# Altium integrated library u025Library.IntLib: 74 symbols (continued)
## Res Pack4
designator R?
Isolated Resistor Network; Published: 24-Mar-1999; LatestRevisionDate: 29-May-2009; LatestRevisionNote: IPC-7351 Footprint Added.; PackageReference: SO-16; Publisher: Altium Limited; PackageDescription: 16-Pin Small Outline Integrated Circuit 1.27 mm Pitch; Code_JEDEC: MS-012-AC; Code_IPC: SOIC127P600-16; Value: *
footprint SMD-Resistor Network 4 0603 (SMD-Resistor Network 4 0603 32mm*16mm)
pins: 1, 2, 3, 4, 5, 6, 7, 8

## RJ45
designator P?
RJ45 Connector
footprint RJ45Min
footprint RJ45 8P8C
pins: 1, 2, 3, 4, 5, 6, 7, 8

## Rocker Switch 3P
designator SW?, comment SW  (value not drawn)
Rocker Switch 3P; Published: 24-Mar-1999; LatestRevisionDate: 17-Jul-2002; LatestRevisionNote: Re-released for DXP Platform.; PackageReference: DIP-4; Publisher: Altium Limited
footprint Rocker Switch 2P Thin Mode
pins: 1 A1, 2 B1
text: ON; OFF

## Rocker Switch Thin
designator SW?, comment SW  (value not drawn)
Rocker Switch Thin; Published: 24-Mar-1999; LatestRevisionDate: 17-Jul-2002; LatestRevisionNote: Re-released for DXP Platform.; PackageReference: DIP-4; Publisher: Altium Limited
footprint Rocker Switch 2P Thin Mode
pins: 1 A1, 2 B1
text: ON; OFF

## RS232
designator P?
RS232 ダ Connector
footprint RS232_そ
footprint RS232_ダ
pins: 1, 2, 3, 4, 5, 6, 7, 8, 9, 10 MH1, 11 MH2

## SingleInverter
designator U?
Single Inverter; Published: 17-Jul-2002; LatestRevisionDate: 06-Jun-2005; LatestRevisionNote: Stylized 3D Model Added; DatasheetVersion: 1989; PackageVersion: 1997; PackageReference: 646-06; Publisher: Altium Limited; PackageDescription: DIP; 14 Leads; Row Spacing 7.62 mm; Pitch 2.54 mm; ComponentLink1Description: Manufacturer Link; ComponentLink1URL: http://www.onsemi.com/site/products/parametrics/0,4446,247,00.html; ComponentLink2Description: Ibis Model; ComponentLink2URL: http://www.onsemi.com/pub/Collateral/MC54HCU04J.IBS
footprint SOT23-5_N (SOT23, 5-Leads, Body 2.9x1.6mm, Pitch 0.95mm, Lead Span 2.8mm, IPC Medium Density)
pins: 2 A (in), 3 G, 4 Y (out), 5 Vcc

## SMD LED
designator D?
Typical RED GaAs LED; Published: 8-Jun-2000; LatestRevisionDate: 08-Jul-2005; LatestRevisionNote: Mech Layer 1 removed.; PackageReference: LED-1; Publisher: Altium Limited; PackageDescription: LED; 2 Leads
footprint SMT LED 0603 (SMT LED; 2 Flat Leads)
footprint SMT LED 0805 (SMT LED; 2 Flat Leads)
footprint SMT LED 1206 (SMT LED; 2 Flat Leads)
pins: 1 A, 2 K

## SN74AHC244
designator U?
Octal Buffer/Driver with 3-State Outputs; ComponentAvailability: Obsolete; Published: 8-Jun-2000; LatestRevisionDate: 16-Oct-2006; LatestRevisionNote: IPC-7351 Footprint Added.; DatasheetVersion: Jul-1998; PackageVersion: May-1999; PackageReference: DB020; Publisher: Altium Limited; PackageDescription: 20-Pin Plastic Small Outline Package 0.65 mm Pitch; Code_JEDEC: MO-150-AE; Code_IPC: SOP65P780-20; ComponentLink1Description: Manufacturer Link; ComponentLink1URL: http://www.ti.com/; ComponentLink2Description: Datasheet; ComponentLink2URL: http://www-s.ti.com/sc/ds/sn74ahc244.pdf
footprint TSSOP20 (Shrink Small Outline; 20 Leads; Body Width 4.4 mm; Pitch 0.65 mm)
pins: 1 ~{OE}1, 2 A1, 3 Y8 (hiz), 4 A2, 5 Y7 (hiz), 6 A3, 7 Y6 (hiz), 8 A4, 9 Y5 (hiz), 10 GND (power), 11 A5, 12 Y4 (hiz), 13 A6, 14 Y3 (hiz), 15 A7, 16 Y2 (hiz), 17 A8, 18 Y1 (hiz), 19 ~{OE}2, 20 VCC (power)

## SN74AHCT04D
designator U?
Hex Inverter; Published: 8-Jun-2000; LatestRevisionDate: 13-Apr-2006; LatestRevisionNote: IPC-7351 Footprint Added.; DatasheetVersion: Oct-1998; PackageVersion: Jan-1998; PackageReference: D014; Publisher: Altium Limited; PackageDescription: 14-Pin Small Outline Integrated Circuit 1.27 mm Pitch; Code_IPC: SOIC127P600-14; ComponentLink1Description: Manufacturer Link; ComponentLink1URL: http://www.ti.com/; ComponentLink2Description: Datasheet; ComponentLink2URL: http://www-s.ti.com/sc/ds/sn74ahct04.pdf; ComponentLink3Description: Packaging Specification; ComponentLink3URL: http://focus.ti.com/lit/ml/mpds177/mpds177.pdf
footprint D014_N (SOIC, 14-Leads, Body 8.7x3.9mm, Pitch 1.27mm, IPC Medium Density)
footprint D014_L (SOIC, 14-Leads, Body 8.7x3.9mm, Pitch 1.27mm, IPC High Density)
footprint D014_M (SOIC, 14-Leads, Body 8.7x3.9mm, Pitch 1.27mm, IPC Low Density)
3D model D014 (14-Pin Small Outline Integrated Circuit 1.27 mm Pitch)
signal-integrity model SN74AHCT04D
pins: 1 A1, 2 Y1 (hiz), 3 A2, 4 Y2 (hiz), 5 A3, 6 Y3 (hiz), 7 GND (power), 8 Y4 (hiz), 9 A4, 10 Y5 (hiz), 11 A5, 12 Y6 (hiz), 13 A6, 14 VCC (power)

## SN74ALS151D
designator U?
1-of-8 Data Selector/Multiplexer; Published: 8-Jun-2000; LatestRevisionDate: 13-Apr-2006; LatestRevisionNote: IPC-7351 Footprint Added.; DatasheetVersion: Dec-1994; PackageVersion: Jan-1998; PackageReference: D016; Publisher: Altium Limited; PackageDescription: 16-Pin Small Outline Integrated Circuit 1.27 mm Pitch; Code_IPC: SOIC127P600-16; ComponentLink1Description: Manufacturer Link; ComponentLink1URL: http://www.ti.com/; ComponentLink2Description: Datasheet; ComponentLink2URL: http://www-s.ti.com/sc/ds/sn74als151.pdf
footprint SOIC-16 (SOIC, 16-Leads, Body 9.9x3.9mm, Pitch 1.27mm, IPC Low Density)
pins: 1 D3, 2 D2, 3 D1, 4 D0, 5 Y, 6 W, 7 ~{STB}, 8 GND (power), 9 C, 10 B, 11 A, 12 D7, 13 D6, 14 D5, 15 D4, 16 VCC (power)

## SN74HC138D
designator U?
3-Line to 8-Line Decoder / Demultiplexer; Published: 8-Jun-2000; LatestRevisionDate: 13-Apr-2006; LatestRevisionNote: IPC-7351 Footprint Added.; DatasheetVersion: May-1997; PackageVersion: Jan-1998; PackageReference: D016; Publisher: Altium Limited; PackageDescription: 16-Pin Small Outline Integrated Circuit 1.27 mm Pitch; Code_IPC: SOIC127P600-16; ComponentLink1Description: Manufacturer Link; ComponentLink1URL: http://www.ti.com/; ComponentLink2Description: Datasheet; ComponentLink2URL: http://www-s.ti.com/sc/ds/sn74hc138.pdf
footprint SOIC-16 (SOIC, 16-Leads, Body 9.9x3.9mm, Pitch 1.27mm, IPC Low Density)
pins: 1 A, 2 B, 3 C, 4 ~{OE}2A, 5 ~{OE}2B, 6 OE1, 7 ~{Y}7, 8 GND (power), 9 ~{Y}6, 10 ~{Y}5, 11 ~{Y}4, 12 ~{Y}3, 13 ~{Y}2, 14 ~{Y}1, 15 ~{Y}0, 16 VCC (power)

## SPAD
designator PA?  (value not drawn)
footprint SPAD_1x0.7
footprint SPAD_2.5x8
footprint SPAD_2x4
pins: 1 PAD

## SPX3940
designator U?
1A Low Dropout Voltage Regulator
footprint SOT-223 (1A Low Dropout Voltage Regulator)
pins: 1 Vin, 2 GND, 3 Vout, 4 TAB

## STC12C5201AD
designator U?
footprint SOIC-16 (SOIC, 16-Leads, Body 9.9x3.9mm, Pitch 1.27mm, IPC Low Density)
pins: 1 RST, 2 P3.0/RxD, 3 P3.1/TxD, 4 XTAL1, 5 XTAL2, 6 P3.3/~{INT1}, 7 P3.4/CLKOT0/T0, 8 GND (power), 9 P3.7, 10 P1.0 (oc), 11 P1.1 (oc), 12 P1.2/EX_LVD/RST2 (oc), 13 P1.5 (oc), 14 P1.6 (oc), 15 P1.7 (oc), 16 VCC (power)

## STM8S105X-32
designator U?
STM8 8-bit MCU , 32-pin LQFP,
footprint LQFP-32_N (Thin QFP, 32-Leads, Body 7x7mm, Pitch 0.8mm, IPC Medium Density)
pins: 1 NRST (io), 2 OSCIN/PA1 (in), 3 OSCOUT/PA2 (out), 4 VSS, 5 VCAP (out), 6 VDD, 7 VDDIO, 8 AIN12/PF4 (io), 9 VDDA, 10 VSSA, 11 [I2C_SDA] AIN5/PB5 (io), 12 [I2C_SCL] AIN4/PB4 (io), 13 [TIM1_ETR] AIN3/PB3 (io), 14 [TIM1_CH3N] AIN2/PB2 (io), 15 [TIM1_CH2N] AIN1/PB1 (io), 16 [TIM1_CH1N] AIN0/PB0 (io), 17 PE5/SPI_NSS (io), 18 PC1 (HS)/TIM1_CH1/UART2_CK (io), 19 PC2 (HS)/TIM1_CH2 (io), 20 PC3 (HS)/TIM1_CH3 (io), 21 PC4 (HS)/TIM1_CH4 (io), 22 PC5 (HS)/SPI_SCK (io), 23 PC6 (HS)/SPI_MOSI (io), 24 PC7 (HS)/SPI_MISO (io), 25 PD0 (HS)/TIM3_CH2 [TIM1_BKIN] [CLK_CCO] (io), 26 PD1 (HS)/SWIM (io), 27 PD2 (HS)/TIM3_CH1 [TIM2_CH3] (io), 28 PD3 (HS)/TIM2_CH2 [ADC_ETR] (io), 29 PD4 (HS)/TIM2_CH1 [BEEP] (io), 30 PD5/UART2_TX (io), 31 PD6/UART2_RX (io), 32 PD7/TLI [TIM1_CH4] (io)

## STM32F10X-48
designator U?
STM32 ARM-based 32-bit MCU , 48-pin LQFP, Industrial Temperature; Published: 30-May-2008; DatasheetVersion: rev6, Mar-2008; PackageVersion: Mar-2008; PackageReference: LQFP48; Publisher: Altium Limited; PackageDescription: 48-Pin Low-Profile Quad Flat Pack, 7 x 7 mm Body, 0.5 mm Pitch (LQFP48); ComponentLink1Description: Manufacturer Link; ComponentLink1URL: www.st.com/stm32; ComponentLink2Description: Datasheet; ComponentLink2URL: http://www.st.com/stonline/products/literature/ds/13587.pdf
footprint LQFP48_N (Thin QFP, 48-Leads, Body 7x7mm, Pitch 0.5mm, IPC Medium Density)
footprint LQFP48_L (Thin QFP, 48-Leads, Body 7x7mm, Pitch 0.5mm, IPC High Density)
footprint LQFP48_M (Thin QFP, 48-Leads, Body 7x7mm, Pitch 0.5mm, IPC Low Density)
footprint LQFP48_OutSide (Thin QFP, 48-Leads, Body 7x7mm, Pitch 0.5mm, IPC Medium Density)
pins: 1 VBAT (power), 2 PC13-TAMPER-RTC, 3 PC14-OSC32_IN, 4 PC15-OSC32_OUT, 5 OSC_IN/PD0, 6 OSC_OUT/PD1, 7 NRST, 8 VSSA (power), 9 VDDA (power), 10 PA0-WKUP/USART2_CTS/ADC_IN0/TIM2_CH1_ETR, 11 PA1/USART2_RTS/ADC_IN1/TIM2_CH2, 12 PA2/USART2_TX/ADC_IN2/TIM2_CH3, 13 PA3/USART2_RX/ADC_IN3/TIM2_CH4, 14 PA4/SPI1_NSS/USART2_CK/ADC_IN4, 15 PA5/SPI1_SCK/ADC_IN5, 16 PA6/SPI1_MISO/ADC_IN6/TIM3_CH1, 17 PA7/SPI1_MOSI/ADC_IN7/TIM3_CH2, 18 PB0/ADC_IN8/TIM3_CH3, 19 PB1/ADC_IN9/TIM3_CH4, 20 PB2/BOOT1, 21 PB10/I2C2_SCL/USART3_TX, 22 PB11/I2C2_SCL/USART3_RX, 23 VSS_1 (power), 24 VDD_1 (power), 25 PB12/SP12_NSS/I2C2_SMBA1/USART3_CK/TIM1_BKIN, 26 PB13/SP12_SCK/USART3_CTS/TIM1_CH1N, 27 PB14/SP12_MISO/USART3_RTS/TIM1_CH2N, 28 PB15/SP12_MOSI/TIM1_CH3N, 29 PA8/USART1_CK/TIM1_CH1/MCO, 30 PA9/USART1_TX/TIM1_CH2, 31 PA10/USART1_RX/TIM1_CH3, 32 PA11/USART1_CTS/CANRX/USBDM(2)/TIM1_CH4, 33 PA12/USART1_RTS/CANTX/USBDM(2)/TIM1_ETR, 34 PA13/JTMS-SWDAT, 35 VSS_2 (power), 36 VDD_2 (power), 37 PA14/JTCK/SWCLK, 38 PA15/JTDI, 39 PB3/JTDO, 40 PB4/JNTRST, 41 PB5/I2C1_SMBA1, 42 PB6/I2C1_SCL/TIM4_CH1, 43 PB7/I2C1_SDA/TIM4_CH2, 44 BOOT0, 45 PB8/TIM4_CH3, 46 PB9/TIM4_CH4, 47 VSS_3 (power), 48 VDD_3 (power)

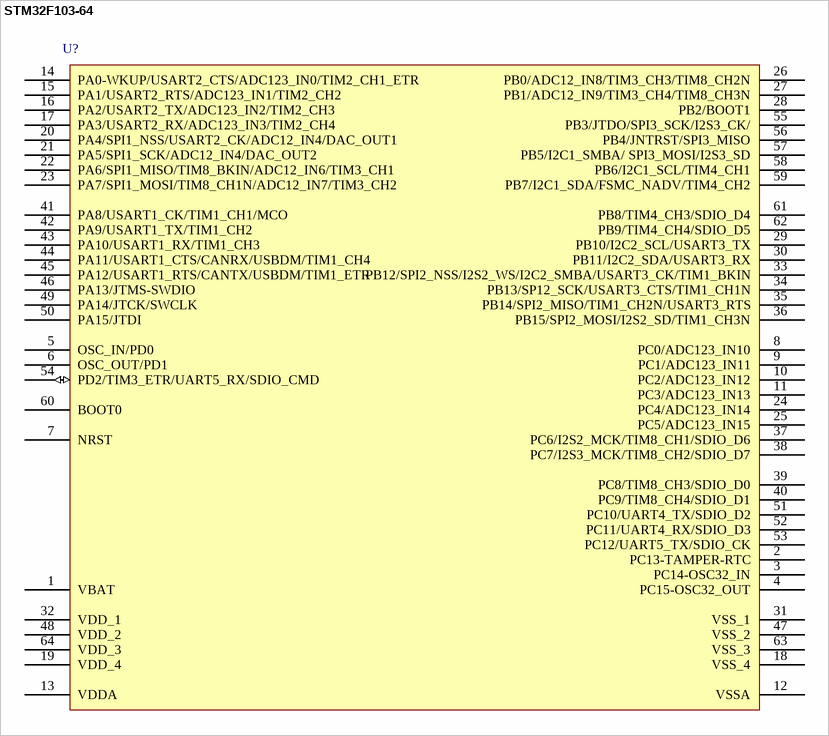
[diagram p2: symbol STM32F103-64]

## STM32F103-64
designator U?
STM32 ARM-based 32-bit MCU with 64 Kbytes Flash, 64-pin LQFP, Industrial Temperature; Published: 30-May-2008; DatasheetVersion: rev6, Mar-2008; PackageVersion: Mar-2008; PackageReference: LQFP64; Publisher: Altium Limited; PackageDescription: 64-Pin Low-Profile Quad Flat Pack, 10 x 10 mm Body, 0.5 mm Pitch (LQFP64); ComponentLink1Description: Manufacturer Link; ComponentLink1URL: www.st.com/stm32; ComponentLink2Description: Datasheet; ComponentLink2URL: http://www.st.com/stonline/products/literature/ds/13587.pdf
footprint LQFP64_N (Thin QFP, 64-Leads, Body 10x10mm, Pitch 0.5mm, IPC Medium Density)
footprint LQFP64_L (Thin QFP, 64-Leads, Body 10x10mm, Pitch 0.5mm, IPC High Density)
footprint LQFP64_M (Thin QFP, 64-Leads, Body 10x10mm, Pitch 0.5mm, IPC Low Density)
footprint LQFP64_OutSide (Thin QFP, 64-Leads, Body 10x10mm, Pitch 0.5mm, IPC Medium Density)
pins: 1 VBAT (power), 2 PC13-TAMPER-RTC, 3 PC14-OSC32_IN, 4 PC15-OSC32_OUT, 5 OSC_IN/PD0, 6 OSC_OUT/PD1, 7 NRST, 8 PC0/ADC123_IN10, 9 PC1/ADC123_IN11, 10 PC2/ADC123_IN12, 11 PC3/ADC123_IN13, 12 VSSA (power), 13 VDDA (power), 14 PA0-WKUP/USART2_CTS/ADC123_IN0/TIM2_CH1_ETR, 15 PA1/USART2_RTS/ADC123_IN1/TIM2_CH2, 16 PA2/USART2_TX/ADC123_IN2/TIM2_CH3, 17 PA3/USART2_RX/ADC123_IN3/TIM2_CH4, 18 VSS_4 (power), 19 VDD_4 (power), 20 PA4/SPI1_NSS/USART2_CK/ADC12_IN4/DAC_OUT1, 21 PA5/SPI1_SCK/ADC12_IN4/DAC_OUT2, 22 PA6/SPI1_MISO/TIM8_BKIN/ADC12_IN6/TIM3_CH1, 23 PA7/SPI1_MOSI/TIM8_CH1N/ADC12_IN7/TIM3_CH2, 24 PC4/ADC123_IN14, 25 PC5/ADC123_IN15, 26 PB0/ADC12_IN8/TIM3_CH3/TIM8_CH2N, 27 PB1/ADC12_IN9/TIM3_CH4/TIM8_CH3N, 28 PB2/BOOT1, 29 PB10/I2C2_SCL/USART3_TX, 30 PB11/I2C2_SDA/USART3_RX, 31 VSS_1 (power), 32 VDD_1 (power), 33 PB12/SPI2_NSS/I2S2_WS/I2C2_SMBA/USART3_CK/TIM1_BKIN, 34 PB13/SP12_SCK/USART3_CTS/TIM1_CH1N, 35 PB14/SPI2_MISO/TIM1_CH2N/USART3_RTS, 36 PB15/SPI2_MOSI/I2S2_SD/TIM1_CH3N, 37 PC6/I2S2_MCK/TIM8_CH1/SDIO_D6, 38 PC7/I2S3_MCK/TIM8_CH2/SDIO_D7, 39 PC8/TIM8_CH3/SDIO_D0, 40 PC9/TIM8_CH4/SDIO_D1, 41 PA8/USART1_CK/TIM1_CH1/MCO, 42 PA9/USART1_TX/TIM1_CH2, 43 PA10/USART1_RX/TIM1_CH3, 44 PA11/USART1_CTS/CANRX/USBDM/TIM1_CH4, 45 PA12/USART1_RTS/CANTX/USBDM/TIM1_ETR, 46 PA13/JTMS-SWDIO (hiz), 47 VSS_2 (power), 48 VDD_2 (power), 49 PA14/JTCK/SWCLK, 50 PA15/JTDI, 51 PC10/UART4_TX/SDIO_D2, 52 PC11/UART4_RX/SDIO_D3, 53 PC12/UART5_TX/SDIO_CK, 54 PD2/TIM3_ETR/UART5_RX/SDIO_CMD (io), 55 PB3/JTDO/SPI3_SCK/I2S3_CK/, 56 PB4/JNTRST/SPI3_MISO, 57 PB5/I2C1_SMBA/ SPI3_MOSI/I2S3_SD, 58 PB6/I2C1_SCL/TIM4_CH1, 59 PB7/I2C1_SDA/FSMC_NADV/TIM4_CH2, 60 BOOT0, 61 PB8/TIM4_CH3/SDIO_D4, 62 PB9/TIM4_CH4/SDIO_D5, 63 VSS_3 (power), 64 VDD_3 (power)

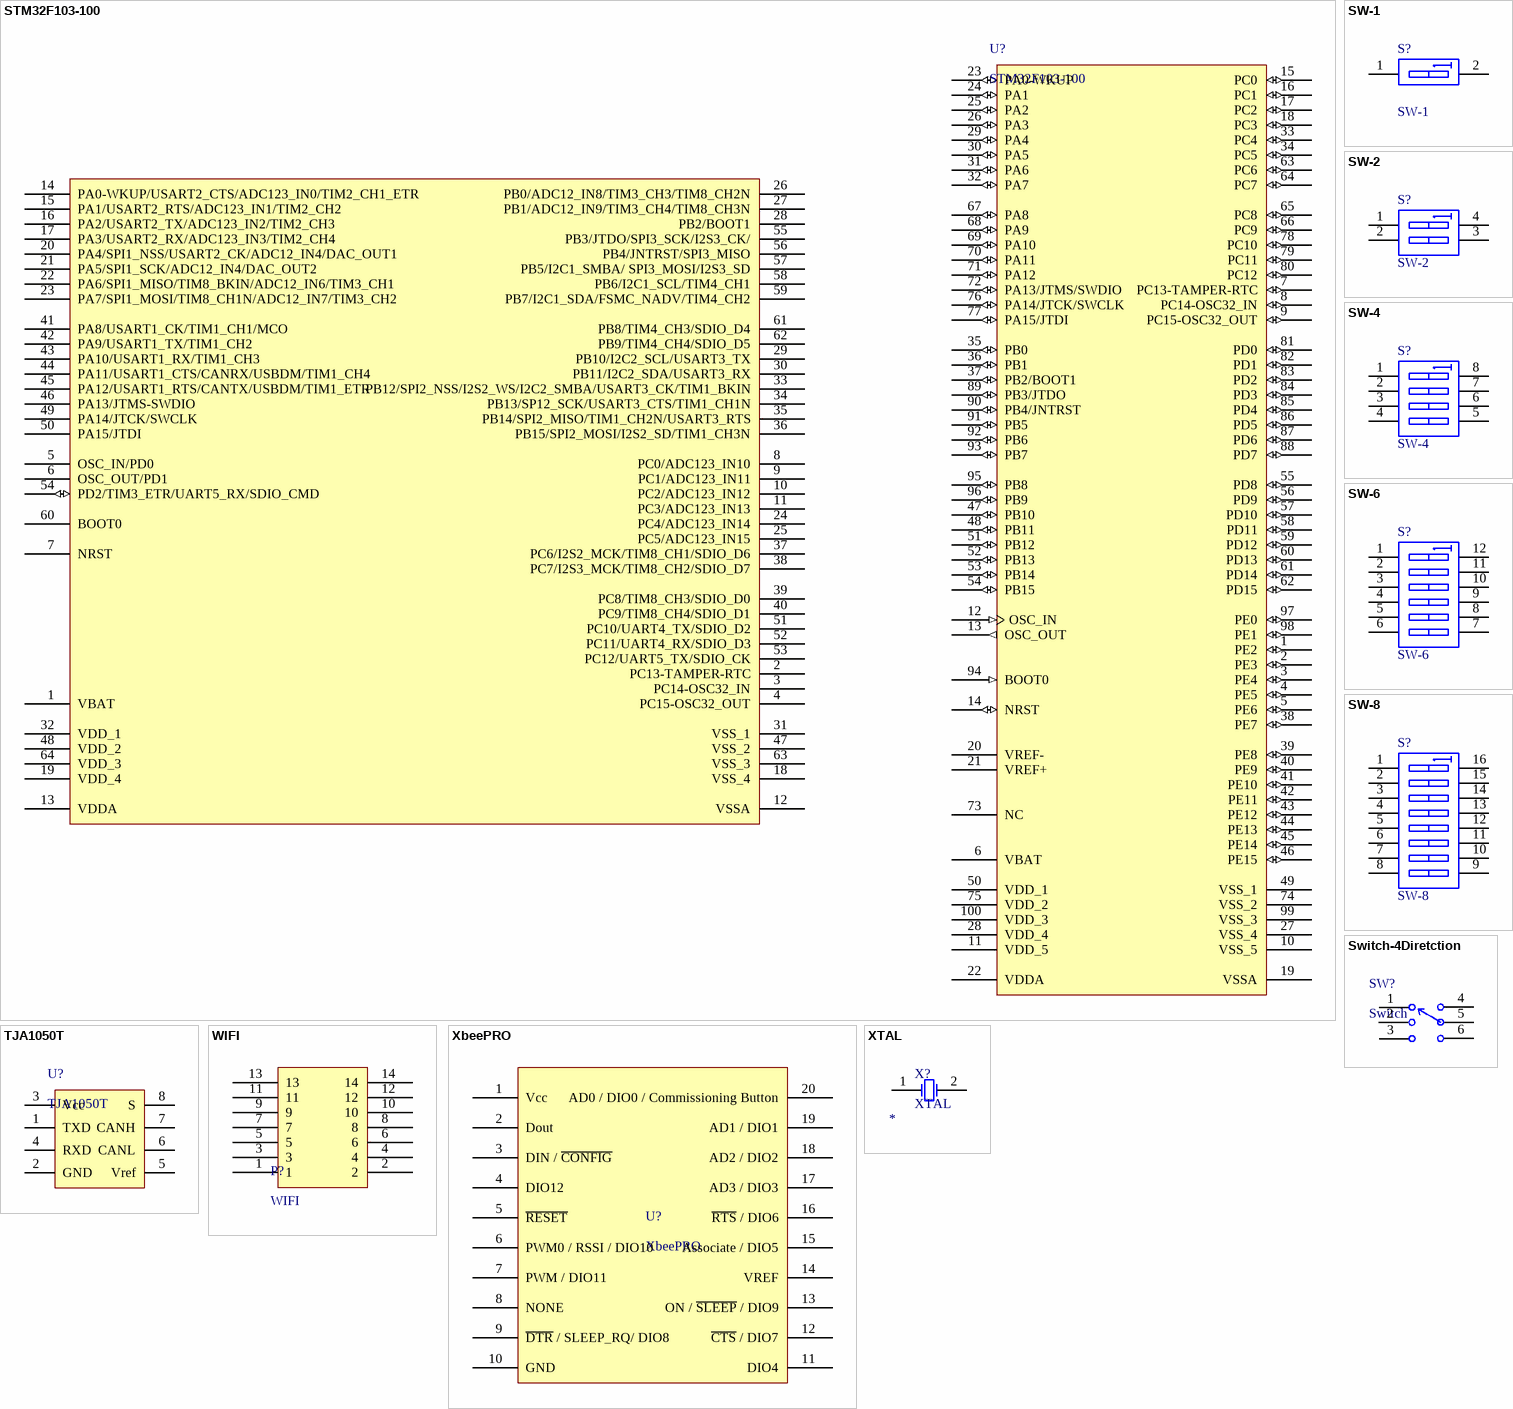
[diagram p3: symbols STM32F103-100 to XTAL]

## STM32F103-100
designator U?
STM32 ARM-based 32-bit MCU with 64 Kbytes Flash, 100-pin LQFP, Industrial Temperature; Published: 30-May-2008; DatasheetVersion: rev6, Mar-2008; PackageVersion: Mar-2008; PackageReference: LQFP100; Publisher: Altium Limited; PackageDescription: 100-Pin Low-Profile Quad Flat Pack, 14 x 14 mm Body, 0.5 mm Pitch (LQFP100); ComponentLink1Description: Manufacturer Link; ComponentLink1URL: www.st.com/stm32; ComponentLink2Description: Datasheet; ComponentLink2URL: http://www.st.com/stonline/products/literature/ds/13587.pdf
footprint LQFP100_N (Thin QFP, 100-Leads, Body 14x14mm, Pitch 0.5mm, IPC Medium Density)
footprint LQFP100_L (Thin QFP, 100-Leads, Body 14x14mm, Pitch 0.5mm, IPC High Density)
footprint LQFP100_M (Thin QFP, 100-Leads, Body 14x14mm, Pitch 0.5mm, IPC Low Density)
pins: 1 PE2 (io), 1 VBAT (power), 2 PE3 (io), 2 PC13-TAMPER-RTC, 3 PE4 (io), 3 PC14-OSC32_IN, 4 PE5 (io), 4 PC15-OSC32_OUT, 5 PE6 (io), 5 OSC_IN/PD0, 6 VBAT (power), 6 OSC_OUT/PD1, 7 PC13-TAMPER-RTC (io), 7 NRST, 8 PC14-OSC32_IN (io), 8 PC0/ADC123_IN10, 9 PC15-OSC32_OUT (io), 9 PC1/ADC123_IN11, 10 VSS_5 (power), 10 PC2/ADC123_IN12, 11 VDD_5 (power), 11 PC3/ADC123_IN13, 12 OSC_IN (in), 12 VSSA (power), 13 OSC_OUT (out), 13 VDDA (power), 14 NRST (io), 14 PA0-WKUP/USART2_CTS/ADC123_IN0/TIM2_CH1_ETR, 15 PC0 (io), 15 PA1/USART2_RTS/ADC123_IN1/TIM2_CH2, 16 PC1 (io), 16 PA2/USART2_TX/ADC123_IN2/TIM2_CH3, 17 PC2 (io), 17 PA3/USART2_RX/ADC123_IN3/TIM2_CH4, 18 PC3 (io), 18 VSS_4 (power), 19 VSSA (power), 19 VDD_4 (power), 20 VREF- (power), 20 PA4/SPI1_NSS/USART2_CK/ADC12_IN4/DAC_OUT1, 21 VREF+ (power), 21 PA5/SPI1_SCK/ADC12_IN4/DAC_OUT2, 22 VDDA (power), 22 PA6/SPI1_MISO/TIM8_BKIN/ADC12_IN6/TIM3_CH1, 23 PA0-WKUP (io), 23 PA7/SPI1_MOSI/TIM8_CH1N/ADC12_IN7/TIM3_CH2, 24 PA1 (io), 24 PC4/ADC123_IN14, 25 PA2 (io), 25 PC5/ADC123_IN15, 26 PA3 (io), 26 PB0/ADC12_IN8/TIM3_CH3/TIM8_CH2N, 27 VSS_4 (power), 27 PB1/ADC12_IN9/TIM3_CH4/TIM8_CH3N, 28 VDD_4 (power), 28 PB2/BOOT1, 29 PA4 (io), 29 PB10/I2C2_SCL/USART3_TX, 30 PA5 (io), 30 PB11/I2C2_SDA/USART3_RX, 31 PA6 (io), 31 VSS_1 (power), 32 PA7 (io), 32 VDD_1 (power), 33 PC4 (io), 33 PB12/SPI2_NSS/I2S2_WS/I2C2_SMBA/USART3_CK/TIM1_BKIN, 34 PC5 (io), 34 PB13/SP12_SCK/USART3_CTS/TIM1_CH1N, 35 PB0 (io), 35 PB14/SPI2_MISO/TIM1_CH2N/USART3_RTS, 36 PB1 (io), 36 PB15/SPI2_MOSI/I2S2_SD/TIM1_CH3N, 37 PB2/BOOT1 (io), 37 PC6/I2S2_MCK/TIM8_CH1/SDIO_D6, 38 PE7 (io), 38 PC7/I2S3_MCK/TIM8_CH2/SDIO_D7, 39 PE8 (io), 39 PC8/TIM8_CH3/SDIO_D0, 40 PE9 (io), 40 PC9/TIM8_CH4/SDIO_D1, 41 PE10 (io), 41 PA8/USART1_CK/TIM1_CH1/MCO, 42 PE11 (io), 42 PA9/USART1_TX/TIM1_CH2, 43 PE12 (io), 43 PA10/USART1_RX/TIM1_CH3, 44 PE13 (io), 44 PA11/USART1_CTS/CANRX/USBDM/TIM1_CH4, 45 PE14 (io), 45 PA12/USART1_RTS/CANTX/USBDM/TIM1_ETR, 46 PE15 (io), 46 PA13/JTMS-SWDIO (hiz), 47 PB10 (io), 47 VSS_2 (power), 48 PB11 (io), 48 VDD_2 (power), 49 VSS_1 (power), 49 PA14/JTCK/SWCLK, 50 VDD_1 (power), 50 PA15/JTDI, 51 PB12 (io), 51 PC10/UART4_TX/SDIO_D2, 52 PB13 (io), 52 PC11/UART4_RX/SDIO_D3, 53 PB14 (io), 53 PC12/UART5_TX/SDIO_CK, 54 PB15 (io), 54 PD2/TIM3_ETR/UART5_RX/SDIO_CMD (io), 55 PD8 (io), 55 PB3/JTDO/SPI3_SCK/I2S3_CK/, 56 PD9 (io), 56 PB4/JNTRST/SPI3_MISO, 57 PD10 (io), 57 PB5/I2C1_SMBA/ SPI3_MOSI/I2S3_SD, 58 PD11 (io), 58 PB6/I2C1_SCL/TIM4_CH1, 59 PD12 (io), 59 PB7/I2C1_SDA/FSMC_NADV/TIM4_CH2, 60 PD13 (io), 60 BOOT0, 61 PD14 (io), 61 PB8/TIM4_CH3/SDIO_D4, 62 PD15 (io), 62 PB9/TIM4_CH4/SDIO_D5, 63 PC6 (io), 63 VSS_3 (power), 64 PC7 (io), 64 VDD_3 (power), 65 PC8 (io), 66 PC9 (io), 67 PA8 (io), 68 PA9 (io), 69 PA10 (io), 70 PA11 (io), 71 PA12 (io), 72 PA13/JTMS/SWDIO (io), 73 NC, 74 VSS_2 (power), 75 VDD_2 (power), 76 PA14/JTCK/SWCLK (io), 77 PA15/JTDI (io), 78 PC10 (io), 79 PC11 (io), 80 PC12 (io), 81 PD0 (io), 82 PD1 (io), 83 PD2 (io), 84 PD3 (io), 85 PD4 (io), 86 PD5 (io), 87 PD6 (io), 88 PD7 (io), 89 PB3/JTDO (io), 90 PB4/JNTRST (io), 91 PB5 (io), 92 PB6 (io), 93 PB7 (io), 94 BOOT0 (in), 95 PB8 (io), 96 PB9 (io), 97 PE0 (io), 98 PE1 (io), 99 VSS_3 (power), 100 VDD_3 (power)

## SW-1
designator S?
Switch, 2 Position, SPST; Published: 24-Mar-1999; LatestRevisionDate: 17-Jul-2002; LatestRevisionNote: Re-released for DXP Platform.; PackageReference: DIP-4; Publisher: Altium Limited
footprint DIP_SW_1WAY_DIP (DIP; 2 Leads; Row Spacing 7.62 mm; Pitch 2.54 mm)
pins: 1 A1, 2 B1

## SW-2
designator S?
Switch, 2 Position, SPST; Published: 24-Mar-1999; LatestRevisionDate: 17-Jul-2002; LatestRevisionNote: Re-released for DXP Platform.; PackageReference: DIP-4; Publisher: Altium Limited
footprint DIP_SW_2WAY_SMD (DIP Switch; 4 Leads)
footprint DIP_SW_2WAY_DIP (DIP; 4 Leads; Row Spacing 7.62 mm; Pitch 2.54 mm)
footprint DIP_SW_2WAY_SMD_1.27 (DIP Switch; 4 Leads)
pins: 1 A1, 2 A2, 3 B2, 4 B1

## SW-4
designator S?
Switch, 4 Position, SPST; Published: 24-Mar-1999; LatestRevisionDate: 29-May-2009; LatestRevisionNote: IPC-7351 Footprint Added.; PackageVersion: Dec-2002; PackageReference: SO8; Publisher: Altium Limited; PackageDescription: 8-Pin Small Outline Integrated Circuit 1.27 mm Pitch; Code_JEDEC: MS-012-AA; Code_IPC: SOIC127P600-8
footprint DIP_SW_4WAY_DIP (DIP; 4 Leads; Row Spacing 7.62 mm; Pitch 2.54 mm)
footprint DIP_SW_4WAY_SMD (DIP Switch; 8 Leads)
footprint DIP_SW_4WAY_SMD_1.27 (DIP Switch; 8 Leads)
pins: 1 A1, 2 A2, 3 A3, 4 A4, 5 B4, 6 B3, 7 B2, 8 B1

## SW-6
designator S?
Switch, 6 Position, SPST; Published: 24-Mar-1999; LatestRevisionDate: 17-Jul-2002; LatestRevisionNote: Re-released for DXP Platform.; PackageReference: DIP-12/SW; Publisher: Altium Limited; PackageDescription: DIP Switch; 12 Leads
footprint DIP_SW_6WAY_DIP (DIP; 12 Leads; Row Spacing 7.62 mm; Pitch 2.54 mm)
footprint DIP_SW_6WAY_SMD (DIP Switch; 12 Leads)
footprint DIP_SW_6WAY_SMD_1.27 (DIP Switch; 12 Leads)
pins: 1 A1, 2 A2, 3 A3, 4 A4, 5 A5, 6 A6, 7 B6, 8 B5, 9 B4, 10 B3, 11 B2, 12 B1

## SW-8
designator S?
Switch, 8 Position, SPST; Published: 24-Mar-1999; LatestRevisionDate: 17-Jul-2002; LatestRevisionNote: Re-released for DXP Platform.; PackageReference: DIP_SW_8WAY_SMD; Publisher: Altium Limited; PackageDescription: DIP Switch; 16 Leads
footprint DIP_SW_8WAY_DIP (DIP; 16 Leads; Row Spacing 7.62 mm; Pitch 2.54 mm)
footprint DIP_SW_8WAY_SMD (DIP Switch; 16 Leads)
footprint DIP_SW_8WAY_SMD_1.27 (DIP Switch; 16 Leads)
pins: 1 A1, 2 A2, 3 A3, 4 A4, 5 A5, 6 A6, 7 A7, 8 A8, 9 B8, 10 B7, 11 B6, 12 B5, 13 B4, 14 B3, 15 B2, 16 B1

## Switch-4Diretction
designator SW?, comment Switch
Switch 4 Diretction
footprint Botton 4 Direction SMD
pins: 1, 2, 3, 4, 5, 6

## TJA1050T
designator U?
TJA1050T CAN BUS Transceiver
footprint SOIC8N_M (SOIC, 8-Leads, Body 4.9x3.9mm, Pitch 1.27mm, IPC Low Density)
pins: 1 TXD (power), 2 GND, 3 Vcc, 4 RXD "Not Connected", 5 Vref, 6 CANL, 7 CANH, 8 S

## WIFI
designator P?
footprint WIFI
pins: 1, 2, 3, 4, 5, 6, 7, 8, 9, 10, 11, 12, 13, 14

## XbeePRO
designator U?
footprint XbeePRO
pins: 1 Vcc, 2 Dout, 3 DIN / ~{CONFIG}, 4 DIO12, 5 ~{RESET}, 6 PWM0 / RSSI / DIO10, 7 PWM / DIO11, 8 NONE, 9 ~{DTR} / SLEEP_RQ/ DIO8, 10 GND, 11 DIO4, 12 ~{CTS} / DIO7, 13 ON / ~{SLEEP} / DIO9, 14 VREF, 15 Associate / DIO5, 16 ~{RTS} / DIO6, 17 AD3 / DIO3, 18 AD2 / DIO2, 19 AD1 / DIO1, 20 AD0 / DIO0 / Commissioning
Button

## XTAL
designator X?
Value: *
footprint CRYSTAL
footprint CRYSTAL-3X8
footprint CRYSTAL-2x6 (CRYSTAL - 2mm x 6mm)
pins: 1 OSC1, 2 OSC2